# Altium footprint library MyLib.PcbLib: 575 footprints (part 19 of 36)
Each footprint in its own frame and in the unit in brackets; x right, y up, seen from the top. Pads: shape width x height; smd on the part's side, far side on the other; paste and mask are expansions set on the pad; w line width, h text height; cw(c..) or ccw(c..) is an arc to the next point about the centre after c.
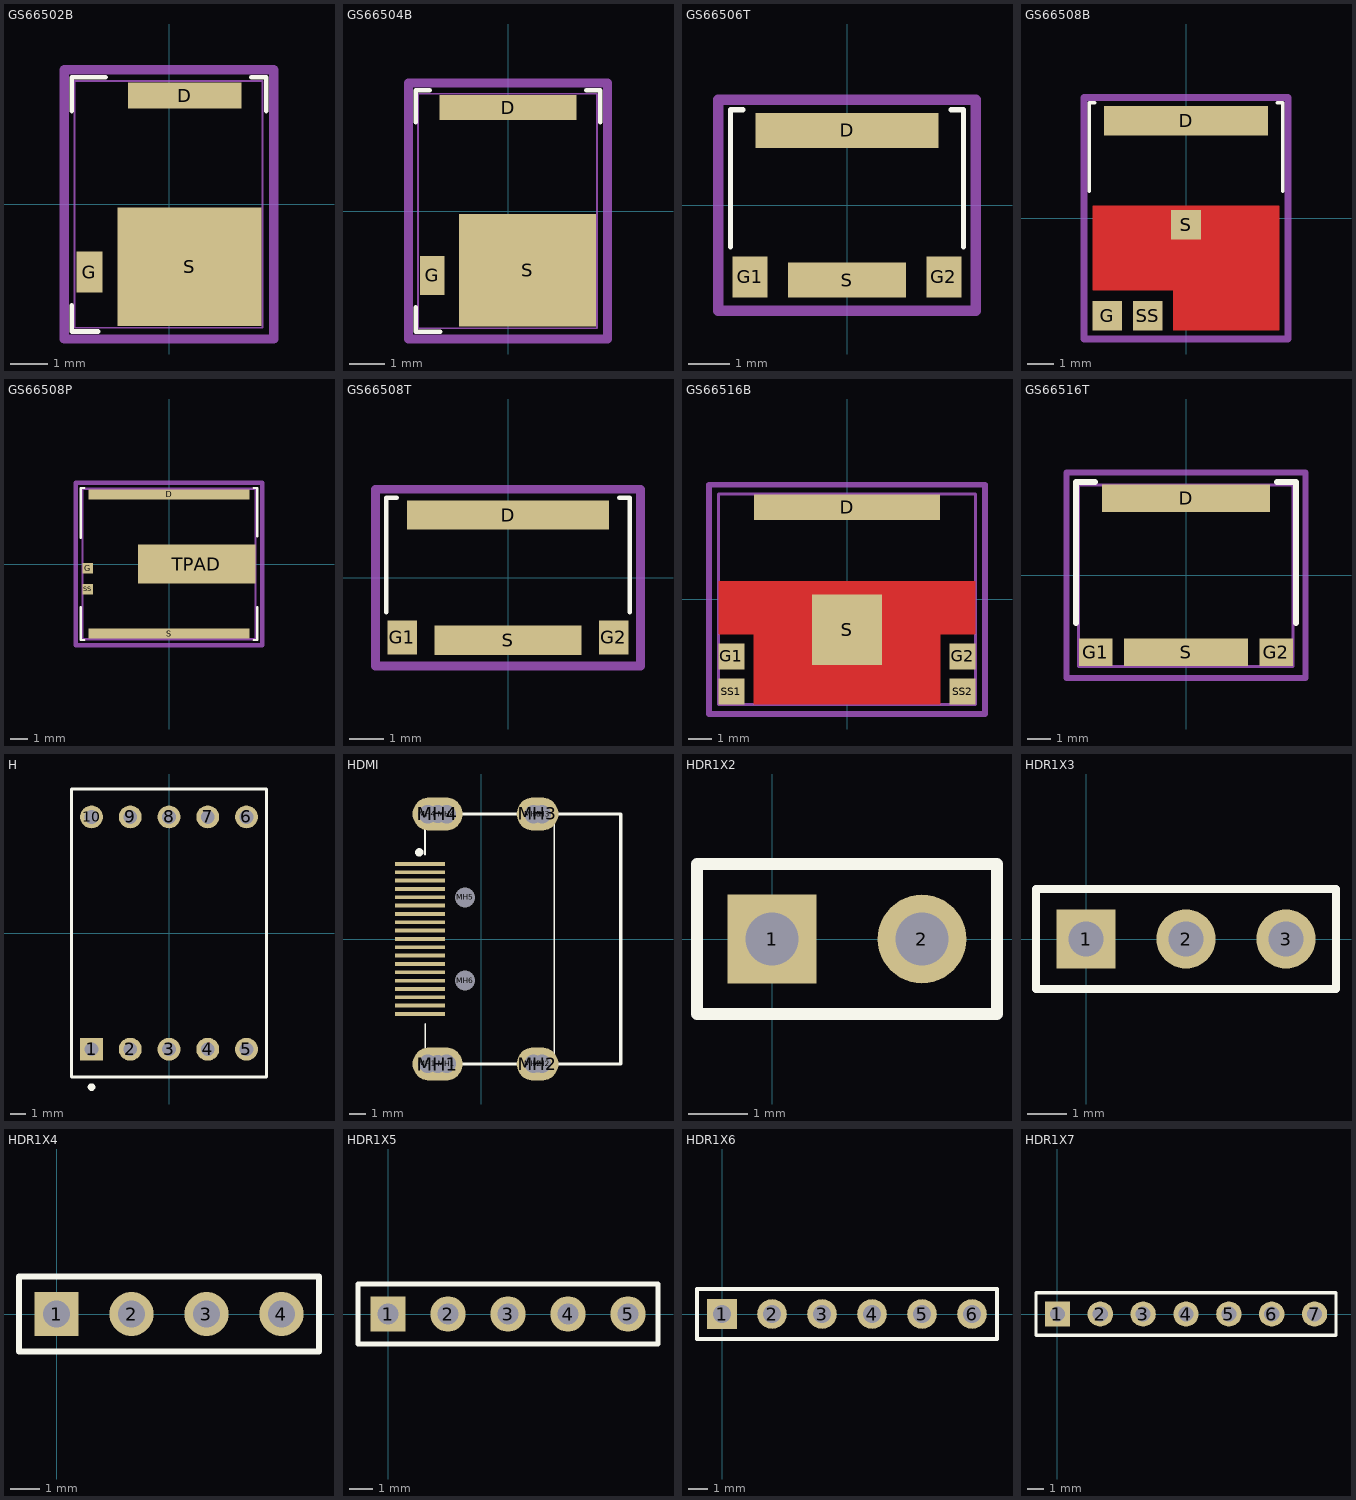
[diagram p18: the footprints below, top view; thin cyan lines are the x and y axes]

## GS66502B [mm] "GAN TRANS E-MODE 650V"
height 0.45
pads (3):
  rect 3.03x0.7 smd: D(0.42,2.91)
  rect 0.7x1.1 smd: G(-2.13,-1.81)
  rect 3.86x3.17 smd: S(0.55,-1.67)
Top Overlay:
  lines w0.127: -2.6,-2.7 -2.6,-3.4 -1.9,-3.4 ; -2.6,2.5 -2.6,3.4 -1.7,3.4 ; 2.2,3.4 2.6,3.4 2.6,2.5
Mechanical 1:
  lines w0.05: -2.53,-3.3 2.5,-3.3 2.5,3.3 -2.53,3.3 -2.53,-3.3
Mechanical 5:
  lines w0.254: -2.8,-3.6 -2.8,3.6 2.8,3.6 2.8,-3.6 -2.8,-3.6
  text ".Designator" at -2.4,-0.3 h1.5
3D body: height 0.5, standoff 0, extent -2.5,-3.3 2.5,3.3

## GS66504B [mm] "GAN TRANS E-MODE 650V"
height 0.45
pads (3):
  rect 3.86x0.7 smd: D(0,2.91)
  rect 0.7x1.1 smd: G(-2.13,-1.81)
  rect 3.86x3.17 smd: S(0.55,-1.67)
Top Overlay:
  lines w0.127: -2.6,-2.7 -2.6,-3.4 -1.9,-3.4 ; -2.6,2.5 -2.6,3.4 -2.2,3.4 ; 2.2,3.4 2.6,3.4 2.6,2.5
Mechanical 1:
  lines w0.05: -2.53,-3.3 -2.53,3.3 2.5,3.3 2.5,-3.3 -2.53,-3.3
Mechanical 5:
  lines w0.254: -2.8,-3.6 2.8,-3.6 2.8,3.6 -2.8,3.6 -2.8,-3.6
  text ".Designator" at -2.4,-0.3 h1.5
3D body: height 0.5, standoff 0, extent -2.5,-3.3 2.5,3.3

## GS66506T [mm] "GAN TRANS EMODE 650V 23A TOP SIDE COOL"
pads (4):
  rect 4.4x0.84 smd paste-0.1: D(0,1.8)
  rect 0.84x0.99 smd paste-0.1: G1(-2.33,-1.72)
  rect 0.84x0.99 smd: G2(2.33,-1.72)
  rect 2.83x0.84 smd paste-0.1: S(0,-1.8)
Top Overlay:
  lines w0.127: -2.8,-1 -2.8,2.3 -2.5,2.3 ; 2.5,2.3 2.8,2.3 2.8,-1
Mechanical 5:
  lines w0.254: -3.1,-2.54 -3.1,2.54 3.1,2.54 3.1,-2.54 -3.1,-2.54
  text ".Designator" at -2,-0.7 h2.54
3D body: height 0.5, standoff 0, extent -2.75,-2.25 2.75,2.25

## GS66508B [mm] "GAN TRANS E-MODE 650V 30A"
height 0.45
pads (4):
  rect 6.1x1.1 smd: D(0,3.63)
  rect 1.1x1.1 smd: G(-2.93,-3.63) S(0,-0.25) SS(-1.42,-3.63)
Top Layer:
  region: -3.475,0.475 3.475,0.475 3.475,-4.175 -0.475,-4.175 -0.475,-2.675 -3.475,-2.675
Top Overlay:
  lines w0.127: -3.6,1 -3.6,4.3 -3.4,4.3 ; 3.4,4.3 3.6,4.3 3.6,1
Top Paste:
  region: -3.475,0.475 3.475,0.475 3.475,-4.175 -0.475,-4.175 -0.475,-2.675 -3.475,-2.675
Top Solder:
  region: -3.475,0.475 3.475,0.475 3.475,-4.175 -0.475,-4.175 -0.475,-2.675 -3.475,-2.675
Mechanical 5:
  lines w0.254: -3.8,-4.5 3.8,-4.5 3.8,4.5 -3.8,4.5 -3.8,-4.5
  text ".Designator" at -2.8,0.1 h2.5
3D body: height 0.5, standoff 0, extent -3.5,-4.2 3.5,4.2

## GS66508P [mm] "GAN TRANS E-MODE 650V 34A"
height 0.45
pads (5):
  rect 9.3x0.6 smd: D(0,4.02) S(0,-4.02)
  rect 0.6x0.6 smd: G(-4.7,-0.25) SS(-4.7,-1.45)
  rect 6.8x2.23 smd: TPAD(1.6,0)
Top Overlay:
  lines w0.127: -5.1,-2.5 -5.1,-4.4 -4.9,-4.4 ; -5.1,1.5 -5.1,4.4 -4.9,4.4 ; 4.9,-4.4 5.1,-4.4 5.1,-2.5 ; 4.9,4.4 5.1,4.4 5.1,1.6
Mechanical 1:
  lines w0.127: -5,-4.35 -5,4.35 5,4.35 5,-4.35 -5,-4.35
Mechanical 5:
  lines w0.254: -5.4,-4.7 -5.4,4.7 5.4,4.7 5.4,-4.7 -5.4,-4.7
  text ".Designator" at -4.3,-0.9 h3.81
3D body: height 0.5, standoff 0, extent -5,-4.35 5,4.35

## GS66508T [mm] "GAN TRANS EMODE 650V 30A TOP SIDE COOL"
pads (4):
  rect 5.81x0.84 smd paste-0.1: D(0,1.8)
  rect 0.84x0.99 smd paste-0.1: G1(-3.04,-1.72)
  rect 0.84x0.99 smd: G2(3.04,-1.72)
  rect 4.24x0.84 smd paste-0.1: S(0,-1.8)
Top Overlay:
  lines w0.127: -3.5,-1 -3.5,2.3 -3.2,2.3 ; 3.2,2.3 3.5,2.3 3.5,-1
Mechanical 5:
  lines w0.254: -3.81,-2.54 3.81,-2.54 3.81,2.54 -3.81,2.54 -3.81,-2.54
  text ".Designator" at -3.048,-0.254 h2.54
3D body: height 0.5, standoff 0.05, extent -3.5,-2.25 3.5,2.25

## GS66516B [mm] "GAN TRANS EMODE 650V 60A BOT SIDE COOL"
height 0.5
pads (6):
  rect 7.97x1.1 smd: D(0,3.94)
  rect 1.1x1.1 smd: G1(-4.94,-2.44) G2(4.94,-2.44) SS1(-4.94,-3.94) SS2(4.94,-3.94)
  rect 3x3 smd: S(0,-1.3)
Top Layer:
  region: -5.485,0.785 5.485,0.785 5.485,-1.485 3.985,-1.485 3.985,-4.485 -3.985,-4.485 -3.985,-1.485 -5.485,-1.485
Mechanical 1:
  lines w0.127: -5.5,-4.5 -5.5,4.5 5.5,4.5 5.5,-4.5 -5.5,-4.5
Mechanical 5:
  lines w0.254: -5.9,-4.9 -5.9,4.9 5.9,4.9 5.9,-4.9 -5.9,-4.9
  text ".Designator" at -4.1,-0.1 h3.81
3D body: height 0.5, standoff 0, extent -5.5,-4.5 5.5,4.5

## GS66516T [mm] "GAN TRANS EMODE 650V 60A TOP SIDE COOL"
height 0.5
pads (4):
  rect 7.04x1.15 smd: D(0,3.22)
  rect 1.4x1.15 smd: G1(-3.77,-3.22) G2(3.77,-3.22)
  rect 5.17x1.15 smd: S(0,-3.22)
Top Overlay:
  lines w0.254: -4.6,-2 -4.6,3.9 -3.8,3.9 ; 3.8,3.9 4.6,3.9 4.6,-2
Mechanical 1:
  lines w0.127: -4.5,-3.825 4.475,-3.825 4.475,3.775 -4.5,3.775 -4.5,-3.825
Mechanical 5:
  lines w0.254: -5,-4.3 5,-4.3 5,4.3 -5,4.3 -5,-4.3
  text ".Designator" at -4.064,-1.016 h3.81
3D body: height 0.5, standoff 0, extent -4.5,-3.8 4.5,3.8

## H [mm] "LED, 7-Segment Display; 10 Pins; Row Space 15.24 mm; Pitch 2.54 mm"
height 8.25
pads (10):
  rect 1.5x1.5 hole 0.9: 1(-5.08,-7.62)
  round 1.5 hole 0.9: 2(-2.54,-7.62) 3(0,-7.62) 4(2.54,-7.62) 5(5.08,-7.62) 6(5.08,7.62) 7(2.54,7.62) 8(0,7.62) 9(-2.54,7.62) 10(-5.08,7.62)
Top Overlay:
  circle w0.25: c-5.08,-10.1 r0.125
  lines w0.2: -6.4,-9.45 6.4,-9.45 6.4,9.45 -6.4,9.45 -6.4,-9.45

## HDMI [mm]
pads (33):
  rect 3x0.23 smd: 1(-3.656,4.5) 2(-3.656,4) 3(-3.656,3.5) 4(-3.656,3) 5(-3.656,2.5) 6(-3.656,2) 7(-3.656,1.5) 8(-3.656,1) 9(-3.656,0.5) 10(-3.656,0) 11(-3.656,-0.5) 12(-3.656,-1) 13(-3.656,-1.5) 14(-3.656,-2) 15(-3.656,-2.5) 16(-3.656,-3) 17(-3.656,-3.5) 18(-3.656,-4) 19(-3.656,-4.5)
  round 1.1 hole 1.1: MH1(-3.202,-7.493) MH1(-2.059,-7.493) MH2(3.148,-7.493) MH2(3.656,-7.493) MH3(3.148,7.493) MH3(3.656,7.493) MH4(-3.202,7.493) MH4(-2.059,7.493)
  oval 3x2 hole 1.1: MH1(-2.606,-7.5) MH4(-2.606,7.5)
  oval 2.5x2 hole 1: MH2(3.394,-7.5) MH3(3.394,7.5)
  round 1.1 hole 1.2: MH5(-0.956,2.5) MH6(-0.956,-2.5)
Top Overlay:
  circle w0.25: c-3.706,5.2 r0.125
  lines w0.1: -3.356,-5.08 -3.356,-7.5 3.894,-7.5 ; -3.356,5.073 -3.356,7.493 ; -3.213,7.5 4.037,7.5 ; 4.394,-7.5 4.394,7.5 ; 8.394,-7.5 8.394,7.5
  lines w0.2: -1.256,-7.5 3.894,-7.5 ; -1.256,7.5 3.394,7.5 ; 3.783,-7.5 8.394,-7.5 8.394,7.5 4.545,7.5
Mechanical 1:
  lines w0.1: -3.106,-8.05 cw(c-3.106,-7.5) -3.106,-6.95 -2.106,-6.95 cw(c-2.106,-7.5) -2.106,-8.05 -3.106,-8.05 ; -3.106,6.95 cw(c-3.106,7.5) -3.106,8.05 -2.106,8.05 cw(c-2.106,7.5) -2.106,6.95 -3.106,6.95 ; 3.148,-8.05 cw(c3.148,-7.5) 3.148,-6.95 3.656,-6.95 cw(c3.656,-7.5) 3.656,-8.05 3.148,-8.05 ; 3.148,6.95 cw(c3.148,7.5) 3.148,8.05 3.656,8.05 cw(c3.656,7.5) 3.656,6.95 3.148,6.95
3D body "User Library-10029449-001LF.STEP": height 5.98, standoff -2.02, extent -3.505,-8.354 6.395,7.846

## HDR1X2 [mm] "Connector; Header; 2 Position"
pads (2):
  rect 1.5x1.5 hole 0.9: 1(0,0)
  round 1.5 hole 0.9: 2(2.54,0)
Top Overlay:
  lines w0.2: -1.27,-1.27 -1.27,1.27 3.81,1.27 3.81,-1.27 -1.27,-1.27
3D body "HEADER.STEP": height 7.58, standoff -2.94, extent 1.27,-1.27 3.81,1.27
3D body "HEADER.STEP": height 7.58, standoff -2.94, extent -1.27,-1.27 1.27,1.27

## HDR1X3 [mm] "Connector; Header; 3 Position"
pads (3):
  rect 1.5x1.5 hole 0.9: 1(0,0)
  round 1.5 hole 0.9: 2(2.54,0) 3(5.08,0)
Top Overlay:
  lines w0.2: -1.27,-1.27 6.35,-1.27 6.35,1.27 -1.27,1.27 -1.27,-1.27
3D body "HEADER.STEP": height 7.58, standoff -2.94, extent 3.81,-1.27 6.35,1.27
3D body "HEADER.STEP": height 7.58, standoff -2.94, extent 1.27,-1.27 3.81,1.27
3D body "HEADER.STEP": height 7.58, standoff -2.94, extent -1.27,-1.27 1.27,1.27

## HDR1X4 [mm] "Connector; Header; 4 Position"
pads (4):
  rect 1.5x1.5 hole 0.9: 1(0,0)
  round 1.5 hole 0.9: 2(2.54,0) 3(5.08,0) 4(7.62,0)
Top Overlay:
  lines w0.2: -1.27,-1.27 8.89,-1.27 8.89,1.27 -1.27,1.27 -1.27,-1.27
3D body "HEADER.STEP": height 7.58, standoff -2.94, extent 6.35,-1.27 8.89,1.27
3D body "HEADER.STEP": height 7.58, standoff -2.94, extent 3.81,-1.27 6.35,1.27
3D body "HEADER.STEP": height 7.58, standoff -2.94, extent 1.27,-1.27 3.81,1.27
3D body "HEADER.STEP": height 7.58, standoff -2.94, extent -1.27,-1.27 1.27,1.27

## HDR1X5 [mm] "Connector; Header; 5 Position"
pads (5):
  rect 1.5x1.5 hole 0.9: 1(0,0)
  round 1.5 hole 0.9: 2(2.54,0) 3(5.08,0) 4(7.62,0) 5(10.16,0)
Top Overlay:
  lines w0.2: -1.27,-1.27 11.43,-1.27 11.43,1.27 -1.27,1.27 -1.27,-1.27
3D body "HEADER.STEP": height 7.58, standoff -2.94, extent 8.89,-1.27 11.43,1.27
3D body "HEADER.STEP": height 7.58, standoff -2.94, extent 6.35,-1.27 8.89,1.27
3D body "HEADER.STEP": height 7.58, standoff -2.94, extent 3.81,-1.27 6.35,1.27
3D body "HEADER.STEP": height 7.58, standoff -2.94, extent 1.27,-1.27 3.81,1.27
3D body "HEADER.STEP": height 7.58, standoff -2.94, extent -1.27,-1.27 1.27,1.27

## HDR1X6 [mm] "Connector; Header; 6 Position"
pads (6):
  rect 1.5x1.5 hole 0.9: 1(0,0)
  round 1.5 hole 0.9: 2(2.54,0) 3(5.08,0) 4(7.62,0) 5(10.16,0) 6(12.7,0)
Top Overlay:
  lines w0.2: -1.27,-1.27 -1.27,1.27 13.97,1.27 13.97,-1.27 -1.27,-1.27
3D body "HEADER.STEP": height 7.58, standoff -2.94, extent 11.43,-1.27 13.97,1.27
3D body "HEADER.STEP": height 7.58, standoff -2.94, extent 8.89,-1.27 11.43,1.27
3D body "HEADER.STEP": height 7.58, standoff -2.94, extent 6.35,-1.27 8.89,1.27
3D body "HEADER.STEP": height 7.58, standoff -2.94, extent 3.81,-1.27 6.35,1.27
3D body "HEADER.STEP": height 7.58, standoff -2.94, extent 1.27,-1.27 3.81,1.27
3D body "HEADER.STEP": height 7.58, standoff -2.94, extent -1.27,-1.27 1.27,1.27

## HDR1X7 [mm] "Connector; Header; 7 Position"
pads (7):
  rect 1.5x1.5 hole 0.9: 1(0,0)
  round 1.5 hole 0.9: 2(2.54,0) 3(5.08,0) 4(7.62,0) 5(10.16,0) 6(12.7,0) 7(15.24,0)
Top Overlay:
  lines w0.2: -1.27,-1.27 -1.27,1.27 16.51,1.27 16.51,-1.27 -1.27,-1.27
3D body "HEADER.STEP": height 7.58, standoff -2.94, extent 13.97,-1.27 16.51,1.27
3D body "HEADER.STEP": height 7.58, standoff -2.94, extent 11.43,-1.27 13.97,1.27
3D body "HEADER.STEP": height 7.58, standoff -2.94, extent 8.89,-1.27 11.43,1.27
3D body "HEADER.STEP": height 7.58, standoff -2.94, extent 6.35,-1.27 8.89,1.27
3D body "HEADER.STEP": height 7.58, standoff -2.94, extent 3.81,-1.27 6.35,1.27
3D body "HEADER.STEP": height 7.58, standoff -2.94, extent 1.27,-1.27 3.81,1.27
3D body "HEADER.STEP": height 7.58, standoff -2.94, extent -1.27,-1.27 1.27,1.27